# Altium footprint library FULL_CB_REV_C.PcbLib: 46 footprints (part 2 of 3)
Each footprint in its own frame and in the unit in brackets; x right, y up, seen from the top. Pads: shape width x height; smd on the part's side, far side on the other; paste and mask are expansions set on the pad; w line width, h text height; cw(c..) or ccw(c..) is an arc to the next point about the centre after c.
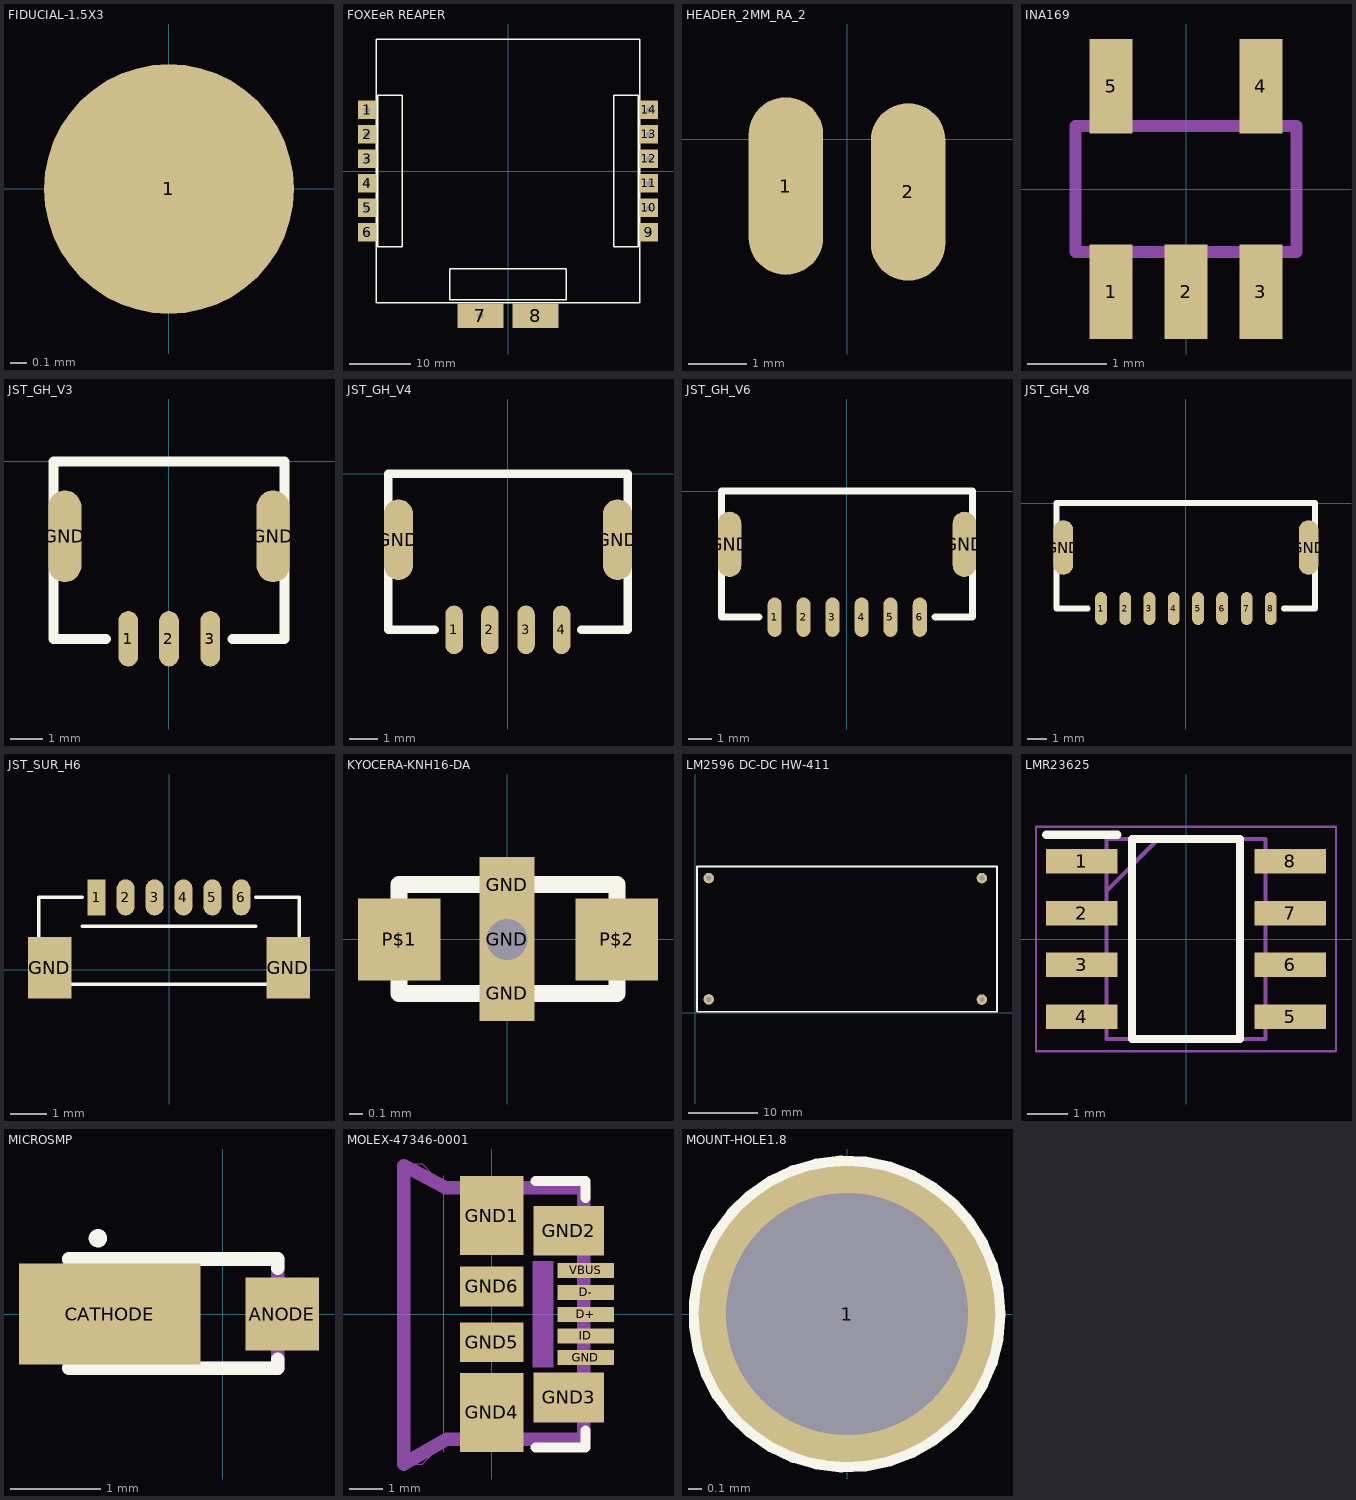
[diagram p1: the footprints below, top view; thin cyan lines are the x and y axes]

## FIDUCIAL-1.5X3 [mil]
pads (1):
  rrect100% 60x60 smd paste-78.74: 1(0,0)
Top Solder:
  circle w50: c0,0 r36

## FOXEeR REAPER [mm] "_128K"
pads (14):
  rect 3x3 hole 1: 1(-23,10) 2(-23,6) 3(-23,2) 4(-23,-2) 5(-23,-6) 6(-23,-10) 9(23,-10) 10(23,-6) 11(23,-2) 12(23,2) 13(23,6) 14(23,10)
  rect 7.5x4 hole 1: 7(-4.5,-23.6)
  rect 7.5x4 smd: 8(4.5,-23.6)
Top Overlay:
  lines w0.254: -21.5,-21.5 21.5,-21.5 21.5,21.5 -21.5,21.5 -21.5,-21.5 ; -21.25,-12.375 -17.25,-12.375 -17.25,12.375 -21.25,12.375 -21.25,-12.375 ; -9.5,-21 9.5,-21 9.5,-15.95 -9.5,-15.95 -9.5,-21 ; 17.25,-12.375 21.25,-12.375 21.25,12.375 17.25,12.375 17.25,-12.375
3D body "ESC Foxxer Reaper 60A v5.step": height 4.5, standoff 0, extent -19.746,-20.25 20.254,20.25

## HEADER_2MM_RA_2 [mil]
pads (2):
  rrect100% 50x119 smd: 1(-41.19,-31.46) 2(40.8,-35.39)

## INA169 [mm]
pads (5):
  rect 0.55x1.2 smd: 1(-0.95,-1.3) 2(0,-1.3) 3(0.95,-1.3) 4(0.95,1.3) 5(-0.95,1.3)
Mechanical 13:
  region: -0.7,-1.501 -1.2,-1.501 -1.2,-0.85 -0.7,-0.85
  region: 0.25,-1.501 -0.25,-1.501 -0.25,-0.85 0.25,-0.85
  region: 1.2,-1.503 0.701,-1.503 0.701,-0.85 1.2,-0.85
  region: 1.2,0.851 0.7,0.851 0.7,1.5 1.2,1.5
  region: -0.7,0.852 -1.202,0.852 -1.202,1.5 -0.7,1.5
  lines w0.152: -1.4,-0.8 1.4,-0.8 1.4,0.8 -1.4,0.8 -1.4,-0.8
3D body "INA169NA_250.stp": height 1.2, standoff 0, extent -1.45,-1.527 1.45,1.273

## JST 6 PIN [mil]
3D body "JST 2.54x6P.step": height 275.59, standoff -118.11, extent -314.21,-109.02 382.64,115.39

## JST_GH_V3 [mil]
pads (5):
  rrect100% 24x67 smd: 1(-49.21,-214.57) 2(0,-214.57) 3(50,-214.57)
  rrect100% 40x111 smd: GND(-125.98,-90.55) GND(126,-90.55)
Top Overlay:
  lines w12: -76.18,-214.57 -139.76,-214.57 -139.76,0 140,0 140,-214.57 77,-214.57
  text "." at -70,-225 h155
3D body "BM03B-GHS-TBT.STEP": height 164.56, standoff -0.8, extent -137.59,-234.88 138,-40

## JST_GH_V4 [mil]
pads (6):
  rrect100% 24x67 smd: 1(-73.82,-214.57) 2(-24.61,-214.57) 3(25,-214.57) 4(74,-214.57)
  rrect100% 40x111 smd: GND(-150.59,-90.55) GND(151,-90.55)
Top Overlay:
  lines w12: -100.79,-214.57 -164.37,-214.57 -164.37,0 165,0 165,-214.57 101,-214.57
  text "." at -95,-225 h155
3D body "BM04B-GHS-TBT.STEP": height 164.56, standoff -0.8, extent -161.8,-235.21 163,-40.33

## JST_GH_V6 [mil]
pads (8):
  rrect100% 24x67 smd: 1(-123.03,-214.57) 2(-73.82,-214.57) 3(-24.61,-214.57) 4(25,-214.57) 5(74,-214.57) 6(124,-214.57)
  rrect100% 40x111 smd: GND(-199.8,-90.55) GND(200,-90.55)
Top Overlay:
  lines w12: -150,-214.57 -213.58,-214.57 -213.58,0 214,0 214,-214.57 150,-214.57
  text "." at -145,-225 h155
3D body "BM06B-GHS-TBT.STEP": height 164.56, standoff -0.8, extent -211.61,-231.88 211.61,-37

## JST_GH_V8 [mil]
pads (10):
  rrect100% 24x67 smd: 1(-172.24,-214.57) 2(-123.03,-214.57) 3(-73.82,-214.57) 4(-24.61,-214.57) 5(25,-214.57) 6(74,-214.57) 7(124,-214.57) 8(173,-214.57)
  rrect100% 40x111 smd: GND(-249.02,-90.55) GND(250,-90.55)
Top Overlay:
  lines w12: -199.21,-214.57 -262.8,-214.57 -262.8,0 263,0 263,-214.57 200,-214.57
  text "." at -195,-225 h155
3D body "BM08B-GHS-TBT.STEP": height 164.56, standoff -0.8, extent -260.65,-233.88 261,-39

## JST_SUR_H6 [mm]
pads (8):
  rect 0.5x1 smd: 1(-2,2)
  rrect100% 0.5x1 smd: 2(-1.2,2) 3(-0.4,2) 4(0.4,2) 5(1.2,2) 6(2,2)
  rect 1.2x1.7 smd: GND(-3.3,0.05) GND(3.3,0.05)
Top Overlay:
  lines w0.1: -2.4,1.2 2.4,1.2 ; -2.4,2 -3.6,2 -3.6,-0.4 3.6,-0.4 3.6,2 2.4,2
  text "." at -2.4,2.8 h0.7
3D body "SM06B-SURS-TF.STEP": height 1.7, standoff -0.05, extent -3.5,-0.4 3.5,2.3

## KYOCERA-KNH16-DA [mil] "KYOCERA-KNH16-DA"
pads (5):
  rect 16x16 smd: GND(0,-15.75) GND(0,16)
  rect 16x16 hole 12: GND(0,0)
  rect 24x24 smd: P$1(-31.5,0) P$2(32,0)
Top Overlay:
  lines w5: -31.5,-15.75 -31.5,16 32,16 32,-15.75 -31.5,-15.75
3D body "KYOCERA-KNH16-DA.STEP": height 13.78, standoff 0, extent -19.68,-9.84 19.68,9.84

## LM2596 DC-DC HW-411 [mil]
pads (4):
  round 60 hole 30: IN+(75.59,767.72) IN-(75.59,75.59) OUT+(1633.86,767.72) OUT-(1633.86,74.8)
Top Overlay:
  lines w10: 8.98,834.13 1720,834.13 1720,5 8.98,5 8.98,835.59
3D body "LM2596DCDC v5.step": height 500, standoff -31.5, extent 4.61,5 1705.39,839.65

## LMR23625 [mm]
pads (8):
  rect 1.75x0.6 smd: 1(-2.55,1.905) 2(-2.55,0.635) 3(-2.55,-0.635) 4(-2.55,-1.905) 5(2.55,-1.905) 6(2.55,-0.635) 7(2.55,0.635) 8(2.55,1.905)
Top Overlay:
  lines w0.2: -3.425,2.555 -1.675,2.555 ; -1.325,-2.45 1.325,-2.45 1.325,2.45 -1.325,2.45 -1.325,-2.45
Mechanical 15:
  lines w0.1: -1.95,1.18 -0.68,2.45 ; -1.95,-2.45 1.95,-2.45 1.95,2.45 -1.95,2.45 -1.95,-2.45
Mechanical 20:
  lines w0.05: -3.675,-2.75 3.675,-2.75 3.675,2.75 -3.675,2.75 -3.675,-2.75
3D body "LMR23625CDDAR.stp": height 1.57, standoff 0, extent -3,-2.45 3,2.45

## MICROSMP [mil]
pads (2):
  rect 32x32 smd: ANODE(26,0)
  rect 79x44 smd: CATHODE(-49.21,0)
Top Overlay:
  circle w4: c-54.33,33 r2
  lines w6: -66.93,-23.62 24,-23.62 24,-19.68 ; -66.93,24 24,24 24,20
Mechanical 16:
  rectangle: -59.05,-21.65 -49.21,22
  rectangle: 26,-11.81 30,12
  rectangle: -74.8,-17.72 -68.89,18
  lines w1: -66.93,-23.62 -66.93,24 24,24 24,-23.62 -66.93,-23.62
  lines w6: -66.93,-23.62 -66.93,24 24,24 24,-23.62 -66.93,-23.62

## MOLEX-47346-0001 [mil]
pads (11):
  rect 67x18 smd: D+(111,0) D-(111,26) GND(111,-51.18) ID(111,-25.59) VBUS(111,52)
  rect 75x94 smd: GND1(0,117) GND4(0,-116.14)
  rect 83x59 smd: GND2(91,99) GND3(91,-98.43)
  rect 75x47 smd: GND5(0,-32.97) GND6(0,33)
Top Overlay:
  lines w12: 52,-157.48 111,-157.48 111,-137.8 ; 52,158 111,158 111,138
Mechanical 8:
  rectangle: 48,-62.99 73,63
Mechanical 16:
  lines w0: -57.09,-163.39 -57.09,164
  lines w1: -106.3,-177.17 -82.68,-177.17 -55.12,-149.61 107,-149.61 111,-145.67 111,146 107,150 -55.12,150 -82.68,178 -106.3,178 -106.3,-177.17
  lines w16: -104.33,-177.17 -53.15,-147.64 109,-147.64 109,150 -55.12,150 -104.33,176 -104.33,-177.17
3D body "473460001.stp": height 107.09, standoff -8.66, extent -93.7,-157.09 120.08,157.09

## MOUNT-HOLE1.8 [mil]
pads (1):
  round 87 hole 71: 1(0,0)
Top Overlay:
  circle w5: c0,0 r44
Bottom Overlay:
  circle w5: c0,0 r44
  circle w5: c0,0 r44